# Altium footprint library PCB Library.PcbLib: 4 footprints
Each footprint in its own frame and in the unit in brackets; x right, y up, seen from the top. Pads: shape width x height; smd on the part's side, far side on the other; paste and mask are expansions set on the pad; w line width, h text height; cw(c..) or ccw(c..) is an arc to the next point about the centre after c.
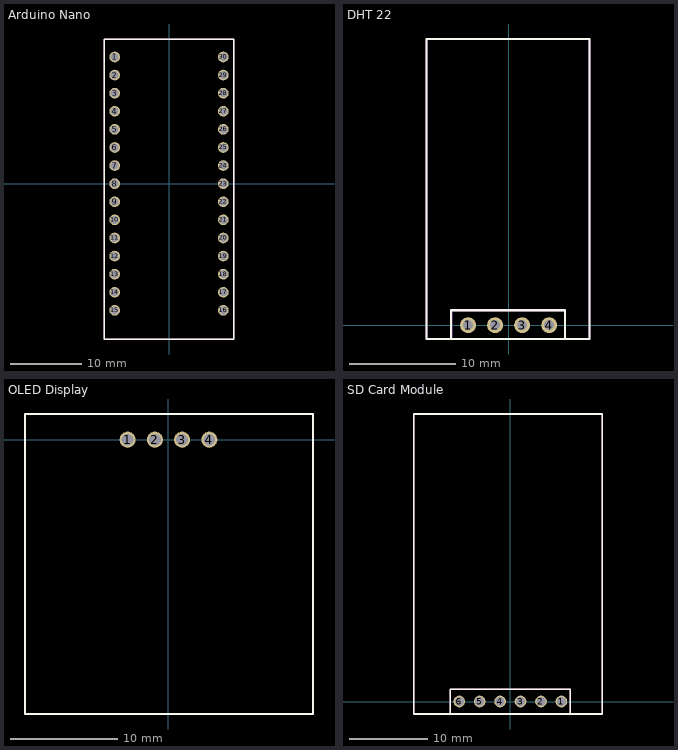
[diagram p0: the footprints below, top view; thin cyan lines are the x and y axes]

## Arduino Nano [mm]
pads (30):
  round 1.5 hole 1.1: 1(-7.625,17.78) 2(-7.625,15.24) 3(-7.625,12.7) 4(-7.625,10.16) 5(-7.625,7.62) 6(-7.625,5.08) 7(-7.625,2.54) 8(-7.625,0) 9(-7.625,-2.54) 10(-7.625,-5.08) 11(-7.625,-7.62) 12(-7.625,-10.16) 13(-7.625,-12.7) 14(-7.625,-15.24) 15(-7.625,-17.78) 16(7.625,-17.78) 17(7.625,-15.24) 18(7.625,-12.7) 19(7.625,-10.16) 20(7.625,-7.62) 21(7.625,-5.08) 22(7.625,-2.54) 23(7.625,0) 24(7.625,2.54) 25(7.625,5.08) 26(7.625,7.62) 27(7.625,10.16) 28(7.625,12.7) 29(7.625,15.24) 30(7.625,17.78)
Top Overlay:
  lines w0.2: -9.1,-21.8 -9.1,20.3 9.1,20.3 9.1,-21.8 -9.1,-21.8
Assemble Layer:
  lines w0.2: -9.1,-21.8 -9.1,20.3 9.1,20.3 9.1,-21.8 -9.1,-21.8
  text "'.Designator'" at 1.167,-23.4 h4
3D body "Arduino Nano.STEP": height 12.61, standoff -5.99, extent -9.005,-21.62 8.995,23.38

## DHT 22 [mm]
pads (4):
  round 1.5 hole 0.95: 1(-3.81,0) 2(-1.27,0) 3(1.27,0) 4(3.81,0)
Top Overlay:
  lines w0.2: -7.71,-1.3 -7.71,26.9 7.59,26.9 7.59,-1.3 -7.71,-1.3 ; -5.41,-1.3 5.29,-1.3 5.29,1.4 -5.41,1.4 -5.41,-1.3
Assemble Layer:
  lines w0.2: -7.71,-1.3 -7.71,26.9 7.59,26.9 7.59,-1.3 -7.71,-1.3 ; -5.4,-1.3 5.3,-1.3 5.3,1.4 -5.4,1.4 -5.4,-1.3
  text "'.Designator'" at 1.59,-3.7 h3
3D body "DHT 22.step": height 8.02, standoff 0.01, extent -7.61,-6.7 7.49,26.9

## OLED Display [mm]
pads (4):
  round 1.5 hole 1.1: 1(-3.81,0) 2(-1.27,0) 3(1.27,0) 4(3.81,0)
Top Overlay:
  lines w0.2: -13.4,-25.6 -13.4,2.4 13.5,2.4 13.5,-25.6 -13.4,-25.6
Assemble Layer:
  lines w0.2: -13.4,-25.6 -13.4,2.4 13.5,2.4 13.5,-25.6 -13.4,-25.6
  text "'.Designator'" at -16.8,-14.3 h3
3D body "OLED Display.step": height 5.02, standoff -5.83, extent -13.31,-25.53 13.39,2.33

## SD Card Module [mm]
pads (6):
  round 1.5 hole 1.15: 1(6.55,0) 2(3.93,0) 3(1.31,0) 4(-1.31,0) 5(-3.93,0) 6(-6.55,0)
Top Overlay:
  lines w0.2: -7.7,-1.6 -7.7,1.6 7.7,1.6 7.7,-1.6 ; -12.4,-1.6 11.8,-1.6 11.8,36.9 -12.4,36.9 -12.4,-1.6
Assemble Layer:
  lines w0.2: -7.7,-1.6 -7.7,1.6 7.7,1.6 7.7,-1.6 ; -12.4,-1.6 11.8,-1.6 11.8,36.9 -12.4,36.9 -12.4,-1.6
  text "'.Designator'" at 1.467,-8.4 h4
3D body "MicroSD Card.stp": height 4.71, standoff -1.99, extent -12.282,-8.402 11.718,38.498